# Altium footprint library HARTING THD.PcbLib: 113 footprints (part 9 of 11)
Each footprint in its own frame and in the unit in brackets; x right, y up, seen from the top. Pads: shape width x height; smd on the part's side, far side on the other; paste and mask are expansions set on the pad; w line width, h text height; cw(c..) or ccw(c..) is an arc to the next point about the centre after c.
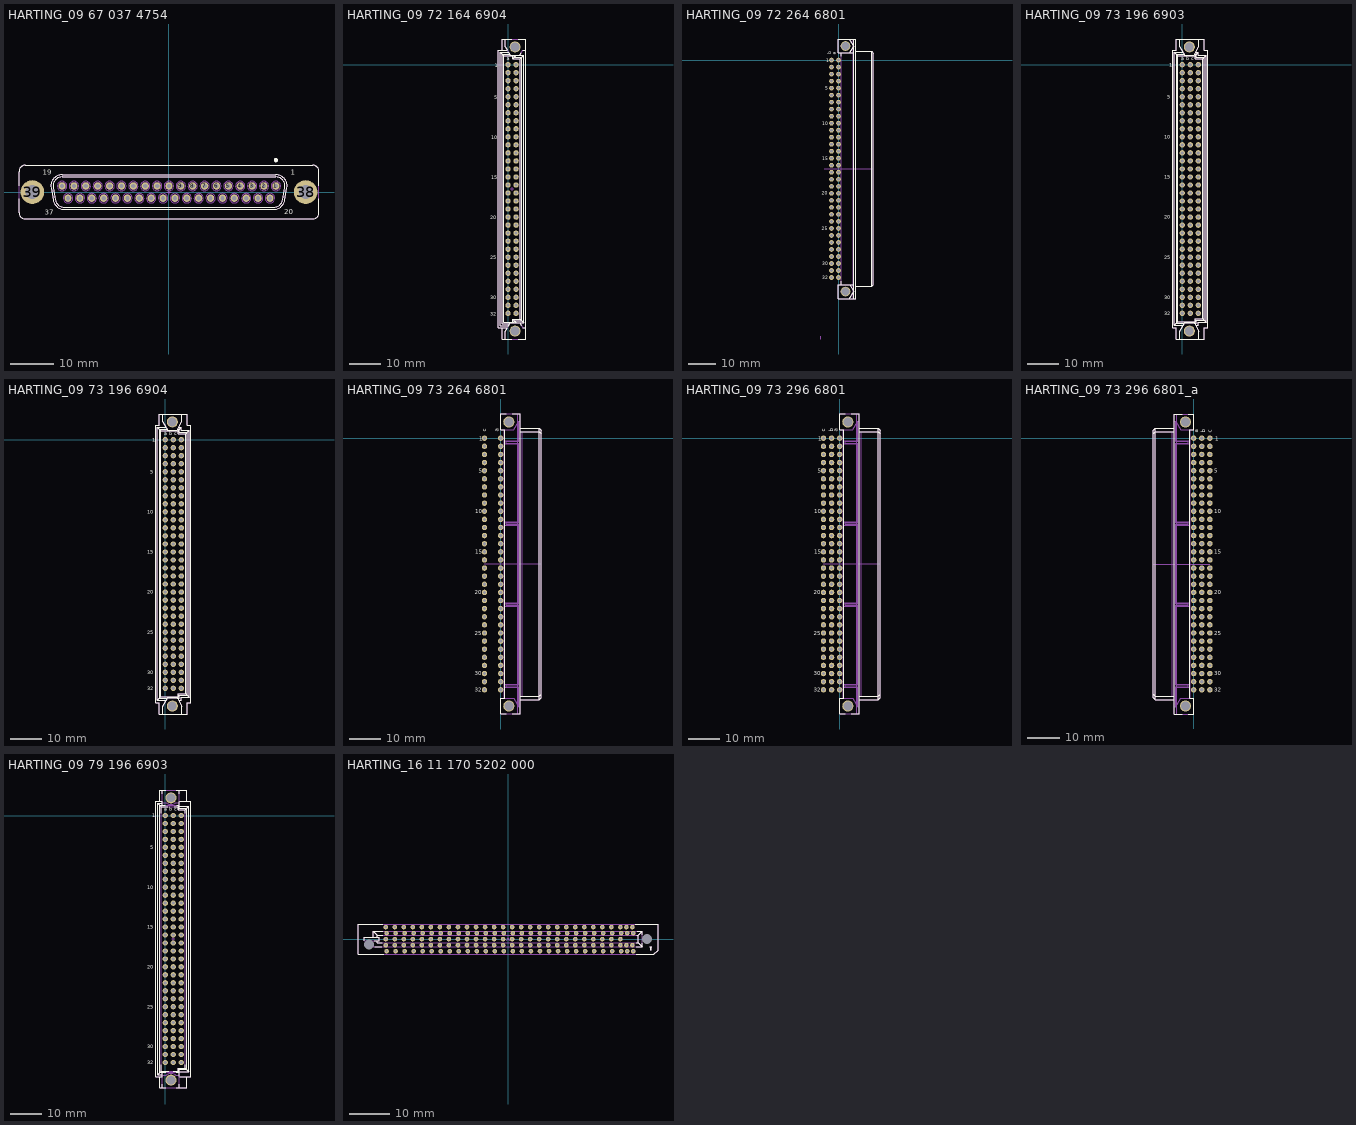
[diagram p8: the footprints below, top view; thin cyan lines are the x and y axes]

## HARTING_09 67 037 4754 [mm] "Straight D-Sub 37 Female Contacts with Turned Soder Contacts and Hole"
height 12.3
pads (39):
  round 1.7 hole 1: 1(24.84,1.42) 2(22.08,1.42) 3(19.32,1.42) 4(16.56,1.42) 5(13.8,1.42) 6(11.04,1.42) 7(8.28,1.42) 8(5.52,1.42) 9(2.76,1.42) 10(0,1.42) 11(-2.76,1.42) 12(-5.52,1.42) 13(-8.28,1.42) 14(-11.04,1.42) 15(-13.8,1.42) 16(-16.56,1.42) 17(-19.32,1.42) 18(-22.08,1.42) 19(-24.84,1.42) 20(23.46,-1.42) 21(20.7,-1.42) 22(17.94,-1.42) 23(15.18,-1.42) 24(12.42,-1.42) 25(9.66,-1.42) 26(6.9,-1.42) 27(4.14,-1.42) 28(1.38,-1.42) 29(-1.38,-1.42) 30(-4.14,-1.42) 31(-6.9,-1.42) 32(-9.66,-1.42) 33(-12.42,-1.42) 34(-15.18,-1.42) 35(-17.94,-1.42) 36(-20.7,-1.42) 37(-23.46,-1.42)
  round 5.5 hole 3.2: 38(31.75,0) 39(-31.75,0)
Top Overlay:
  circle w0.5: c24.84,7.42 r0.25
  lines w0.2: -34.85,-1.5 -34.85,-4.75 ccw(c-33.35,-4.75) -33.35,-6.25 33.35,-6.25 ccw(c33.35,-4.75) 34.85,-4.75 34.85,-1.5 ; -34.85,1.5 -34.85,4.75 cw(c-33.35,4.75) -33.35,6.25 33.35,6.25 cw(c33.35,4.75) 34.85,4.75 34.85,1.5 ; -27.41,0.949 cw(c-24.85,1.4) -24.85,4 24.85,4 cw(c24.85,1.4) 27.411,0.949 26.917,-1.851 cw(c24.356,-1.4) 24.356,-4 -24.356,-4 cw(c-24.356,-1.4) -26.917,-1.851 -27.41,0.949 ; -26.918,1.035 cw(c-24.85,1.4) -24.85,3.5 24.85,3.5 cw(c24.85,1.4) 26.918,1.035 26.424,-1.765 cw(c24.356,-1.4) 24.356,-3.5 -24.356,-3.5 cw(c-24.356,-1.4) -26.424,-1.765 -26.918,1.035
  text "20" at 26.78,-5.2 h1.2
  text "37" at -28.86,-5.27 h1.2
  text "1" at 28.28,4 h1.2
  text "19" at -29.28,4 h1.2
Mechanical 8:
  drawing of 160 lines, arcs and shapes, not listed
Mechanical 14:
  circle w0.1: c24.83,1.4 r1.1
  circle w0.1: c24.83,1.4 r0.7
  circle w0.1: c23.46,-1.42 r1.1
  circle w0.1: c23.46,-1.42 r0.7
  circle w0.1: c22.07,1.4 r1.1
  circle w0.1: c22.07,1.4 r0.7
  circle w0.1: c20.7,-1.42 r1.1
  circle w0.1: c20.7,-1.42 r0.7
  circle w0.1: c19.31,1.4 r1.1
  circle w0.1: c19.31,1.4 r0.7
  circle w0.1: c17.94,-1.42 r1.1
  circle w0.1: c17.94,-1.42 r0.7
  circle w0.1: c16.55,1.4 r1.1
  circle w0.1: c16.55,1.4 r0.7
  circle w0.1: c15.18,-1.42 r1.1
  circle w0.1: c15.18,-1.42 r0.7
  circle w0.1: c13.79,1.4 r1.1
  circle w0.1: c13.79,1.4 r0.7
  circle w0.1: c12.42,-1.42 r1.1
  circle w0.1: c12.42,-1.42 r0.7
  circle w0.1: c11.03,1.4 r1.1
  circle w0.1: c11.03,1.4 r0.7
  circle w0.1: c9.66,-1.42 r1.1
  circle w0.1: c9.66,-1.42 r0.7
  circle w0.1: c8.27,1.4 r1.1
  circle w0.1: c8.27,1.4 r0.7
  circle w0.1: c6.9,-1.42 r1.1
  circle w0.1: c6.9,-1.42 r0.7
  circle w0.1: c5.51,1.4 r1.1
  circle w0.1: c5.51,1.4 r0.7
  circle w0.1: c4.14,-1.42 r1.1
  circle w0.1: c4.14,-1.42 r0.7
  circle w0.1: c2.75,1.4 r1.1
  circle w0.1: c2.75,1.4 r0.7
  circle w0.1: c1.38,-1.42 r1.1
  circle w0.1: c1.38,-1.42 r0.7
  circle w0.1: c-0.01,1.4 r1.1
  circle w0.1: c-0.01,1.4 r0.7
  circle w0.1: c-1.38,-1.42 r1.1
  circle w0.1: c-1.38,-1.42 r0.7
  circle w0.1: c-2.77,1.4 r1.1
  circle w0.1: c-2.77,1.4 r0.7
  circle w0.1: c-4.14,-1.42 r1.1
  circle w0.1: c-4.14,-1.42 r0.7
  circle w0.1: c-5.53,1.4 r1.1
  circle w0.1: c-5.53,1.4 r0.7
  circle w0.1: c-6.9,-1.42 r1.1
  circle w0.1: c-6.9,-1.42 r0.7
  circle w0.1: c-8.29,1.4 r1.1
  circle w0.1: c-8.29,1.4 r0.7
  circle w0.1: c-9.66,-1.42 r1.1
  circle w0.1: c-9.66,-1.42 r0.7
  circle w0.1: c-11.05,1.4 r1.1
  circle w0.1: c-11.05,1.4 r0.7
  circle w0.1: c-12.42,-1.42 r1.1
  circle w0.1: c-12.42,-1.42 r0.7
  circle w0.1: c-13.81,1.4 r1.1
  circle w0.1: c-13.81,1.4 r0.7
  circle w0.1: c-15.18,-1.42 r1.1
  circle w0.1: c-15.18,-1.42 r0.7
  circle w0.1: c-16.57,1.4 r1.1
  circle w0.1: c-16.57,1.4 r0.7
  circle w0.1: c-17.94,-1.42 r1.1
  circle w0.1: c-17.94,-1.42 r0.7
  circle w0.1: c-19.33,1.4 r1.1
  circle w0.1: c-19.33,1.4 r0.7
  circle w0.1: c-20.7,-1.42 r1.1
  circle w0.1: c-20.7,-1.42 r0.7
  circle w0.1: c-22.09,1.4 r1.1
  circle w0.1: c-22.09,1.4 r0.7
  circle w0.1: c-23.46,-1.42 r1.1
  circle w0.1: c-23.46,-1.42 r0.7
  circle w0.1: c-24.85,1.4 r1.1
  circle w0.1: c-24.85,1.4 r0.7
  circle w0.1: c-31.75,0 r1.55
  circle w0.1: c31.75,0 r1.55
  lines w0.1: -34.85,-4.75 ccw(c-33.35,-4.75) -33.35,-6.25 33.35,-6.25 ccw(c33.35,-4.75) 34.85,-4.75 34.85,4.75 ccw(c33.35,4.75) 33.35,6.25 -33.35,6.25 ccw(c-33.35,4.75) -34.85,4.75 -34.85,-4.75 ; -27.41,0.949 cw(c-24.85,1.4) -24.85,4 24.85,4 cw(c24.85,1.4) 27.411,0.949 26.917,-1.851 cw(c24.356,-1.4) 24.356,-4 -24.356,-4 cw(c-24.356,-1.4) -26.917,-1.851 -27.41,0.949 ; -26.918,1.035 cw(c-24.85,1.4) -24.85,3.5 24.85,3.5 cw(c24.85,1.4) 26.918,1.035 26.424,-1.765 cw(c24.356,-1.4) 24.356,-3.5 -24.356,-3.5 cw(c-24.356,-1.4) -26.424,-1.765 -26.918,1.035
  text "20" at 26.78,-5.2 h1.2
  text "37" at -28.86,-5.27 h1.2
  text "1" at 28.28,4 h1.2
  text "19" at -29.28,4 h1.2
3D body "HARTING_09 67 037 4754.stp": height 12, standoff -6, extent -34.85,-6.25 34.85,6.25

## HARTING_09 72 164 6904 [mm] "DIN 41612, Type Q, Thru-Hole Press-in; Rows a+b, 64 Position, Straight Male Connector"
height 11.6
pads (66):
  round 1.7 hole 1: a1(0,0) a2(0,-2.54) a3(0,-5.08) a4(0,-7.62) a5(0,-10.16) a6(0,-12.7) a7(0,-15.24) a8(0,-17.78) a9(0,-20.32) a10(0,-22.86) a11(0,-25.4) a12(0,-27.94) a13(0,-30.48) a14(0,-33.02) a15(0,-35.56) a16(0,-38.1) a17(0,-40.64) a18(0,-43.18) a19(0,-45.72) a20(0,-48.26) a21(0,-50.8) a22(0,-53.34) a23(0,-55.88) a24(0,-58.42) a25(0,-60.96) a26(0,-63.5) a27(0,-66.04) a28(0,-68.58) a29(0,-71.12) a30(0,-73.66) a31(0,-76.2) a32(0,-78.74) b1(2.54,0) b2(2.54,-2.54) b3(2.54,-5.08) b4(2.54,-7.62) b5(2.54,-10.16) b6(2.54,-12.7) b7(2.54,-15.24) b8(2.54,-17.78) b9(2.54,-20.32) b10(2.54,-22.86) b11(2.54,-25.4) b12(2.54,-27.94) b13(2.54,-30.48) b14(2.54,-33.02) b15(2.54,-35.56) b16(2.54,-38.1) b17(2.54,-40.64) b18(2.54,-43.18) b19(2.54,-45.72) b20(2.54,-48.26) b21(2.54,-50.8) b22(2.54,-53.34) b23(2.54,-55.88) b24(2.54,-58.42) b25(2.54,-60.96) b26(2.54,-63.5) b27(2.54,-66.04) b28(2.54,-68.58) b29(2.54,-71.12) b30(2.54,-73.66) b31(2.54,-76.2) b32(2.54,-78.74)
  round 3.5 / inner round 3.5 / far side round 5.1 hole 2.8: MTG1(2.24,5.63) MTG2(2.24,-84.37)
Top Overlay:
  lines w0.2: -1.83,-83.32 -1.83,-86.87 1.22,-86.87 ; -1.83,4.58 -1.83,8.13 1.22,8.13 ; -0.81,-86.87 -0.81,-84.37 -0.327,-83.534 ; -0.81,8.13 -0.81,5.63 -0.327,4.794 ; -0.247,4.58 -3.03,4.58 -3.03,-83.32 -0.204,-83.32 ; 0.184,3.88 -2.48,3.88 ; 0.2,-82.62 -2.48,-82.62 -2.48,3.88 ; 0.232,-82.565 0.749,-81.67 3.731,-81.67 ; 0.232,3.825 0.749,2.93 3.731,2.93 ; 0.576,-81.97 -1.83,-81.97 -1.83,3.23 0.576,3.23 ; 1.67,-81.67 1.52,-81.52 ; 1.67,2.93 1.52,2.78 ; 1.97,-81.67 1.97,-81.02 4.37,-81.02 4.37,2.28 1.97,2.28 1.97,2.93 ; 2.62,-81.67 1.52,-80.57 ; 2.62,2.93 1.52,1.83 ; 3.26,-86.87 5.57,-86.87 5.57,8.13 3.26,8.13 ; 4.248,-82.565 3.731,-81.67 ; 4.248,3.825 3.731,2.93 ; 4.728,-83.32 5.57,-83.323 ; 4.727,4.58 5.57,4.58 ; -2.48,3.88 -1.38,2.78 ; -1.38,2.78 -1.38,-81.52 1.52,-81.52 ; -1.38,2.78 1.52,2.78 ; 1.52,-81.52 1.52,-80.57 ; 1.52,-80.57 3.92,-80.57 ; 1.52,1.83 1.52,2.78 ; 1.52,1.83 3.92,1.83 ; 3.731,-81.67 5.02,-81.67 ; 3.731,2.93 5.02,2.93 ; 3.92,-80.57 5.02,-81.67 ; 3.92,-80.57 3.92,1.83 ; 3.92,1.83 5.02,2.93 ; 5.02,-81.67 5.02,2.93
  text "1" at -4.175,-0.75 h1.2
  text "15" at -5.3,-36.26 h1.2
  text "20" at -5.6,-48.96 h1.2
  text "25" at -5.6,-61.66 h1.2
  text "30" at -5.6,-74.36 h1.2
  text "10" at -5.3,-23.56 h1.2
  text "5" at -4.375,-10.91 h1.2
  text "32" at -5.6,-79.44 h1.2
  text "a" at -0.451,1.385 h1.2
Mechanical 8:
  lines w0.1: -0.5,-78.74 0,-78.74 ; -0.5,0 0,0 ; 0,-79.24 0,-78.74 ; 0,-78.24 0,-78.74 ; 0,-0.5 0,0 ; 0,0.5 0,0 ; 0.5,-78.74 0,-78.74 ; 0.5,0 0,0 ; 0.77,-39.37 1.27,-39.37 ; 1.27,-39.87 1.27,-39.37 ; 1.27,-38.87 1.27,-39.37 ; 1.77,-39.37 1.27,-39.37 ; 2.04,-78.74 2.54,-78.74 ; 2.04,0 2.54,0 ; 2.54,-79.24 2.54,-78.74 ; 2.54,-78.24 2.54,-78.74 ; 2.54,-0.5 2.54,0 ; 2.54,0.5 2.54,0 ; 3.04,-78.74 2.54,-78.74 ; 3.04,0 2.54,0
Mechanical 14:
  circle w0.1: c2.24,-84.37 r1.4
  circle w0.1: c2.24,5.63 r1.4
  lines w0.1: -1.83,-83.32 -1.83,-86.87 5.57,-86.87 5.57,8.13 -1.83,8.13 -1.83,4.58 ; -0.81,-86.87 -0.81,-84.37 0.749,-81.67 3.731,-81.67 ; -0.81,8.13 -0.81,5.63 0.749,2.93 3.731,2.93 ; -0.204,-83.32 -3.03,-83.32 -3.03,4.58 -0.204,4.58 ; 0.2,-82.62 -2.48,-82.62 -2.48,3.88 ; 0.2,3.88 -2.48,3.88 ; 0.576,-81.97 -1.83,-81.97 -1.83,3.23 0.576,3.23 ; 1.67,-81.67 1.52,-81.52 ; 1.67,2.93 1.52,2.78 ; 1.97,-81.67 1.97,-81.02 4.37,-81.02 4.37,2.28 1.97,2.28 1.97,2.93 ; 2.62,-81.67 1.52,-80.57 ; 2.62,2.93 1.52,1.83 ; 5.57,-83.323 4.684,-83.32 3.731,-81.67 ; 5.57,4.58 4.684,4.58 3.731,2.93 ; -2.48,3.88 -1.38,2.78 ; -1.38,2.78 -1.38,-81.52 1.52,-81.52 ; -1.38,2.78 1.52,2.78 ; 1.52,-81.52 1.52,-80.57 ; 1.52,-80.57 3.92,-80.57 ; 1.52,1.83 1.52,2.78 ; 1.52,1.83 3.92,1.83 ; 3.731,-81.67 5.02,-81.67 ; 3.731,2.93 5.02,2.93 ; 3.92,-80.57 5.02,-81.67 ; 3.92,-80.57 3.92,1.83 ; 3.92,1.83 5.02,2.93 ; 5.02,-81.67 5.02,2.93
  text "30" at -5.6,-74.36 h1.2
  text "25" at -5.6,-61.66 h1.2
  text "20" at -5.6,-48.96 h1.2
  text "15" at -5.3,-36.26 h1.2
  text "10" at -5.3,-23.56 h1.2
  text "5" at -4.375,-10.91 h1.2
  text "32" at -5.6,-79.44 h1.2
  text "a" at -0.451,1.385 h1.2
  text "1" at -4.175,-0.75 h1.2
Drill Drawing:
  lines w0.1: -1.83,-59.13 -1.83,-80.585 3.92,-80.585 3.92,1.83 -1.83,1.83 -1.83,-21.03
  text "PRESS-FIT TECHNOLOGY diam. 1mm +0.1 -0" at -1.315,-57.225 h1
3D body "HARTING_09 72 164 6904.stp": height 11.6, standoff -4.8, extent -3.03,-86.87 5.57,8.13

## HARTING_09 72 264 6801 [mm] "DIN 41612, Type Q, Thru-Hole;  Rows a+b, 64 Positions, Performance level 2, Lead 3mm, Pitch 2.54mm, Right Angle Female Connector"
height 8.1
pads (66):
  round 1.7 hole 1: a1(0,0) a2(0,-2.54) a3(0,-5.08) a4(0,-7.62) a5(0,-10.16) a6(0,-12.7) a7(0,-15.24) a8(0,-17.78) a9(0,-20.32) a10(0,-22.86) a11(0,-25.4) a12(0,-27.94) a13(0,-30.48) a14(0,-33.02) a15(0,-35.56) a16(0,-38.1) a17(0,-40.64) a18(0,-43.18) a19(0,-45.72) a20(0,-48.26) a21(0,-50.8) a22(0,-53.34) a23(0,-55.88) a24(0,-58.42) a25(0,-60.96) a26(0,-63.5) a27(0,-66.04) a28(0,-68.58) a29(0,-71.12) a30(0,-73.66) a31(0,-76.2) a32(0,-78.74) b1(-2.54,0) b2(-2.54,-2.54) b3(-2.54,-5.08) b4(-2.54,-7.62) b5(-2.54,-10.16) b6(-2.54,-12.7) b7(-2.54,-15.24) b8(-2.54,-17.78) b9(-2.54,-20.32) b10(-2.54,-22.86) b11(-2.54,-25.4) b12(-2.54,-27.94) b13(-2.54,-30.48) b14(-2.54,-33.02) b15(-2.54,-35.56) b16(-2.54,-38.1) b17(-2.54,-40.64) b18(-2.54,-43.18) b19(-2.54,-45.72) b20(-2.54,-48.26) b21(-2.54,-50.8) b22(-2.54,-53.34) b23(-2.54,-55.88) b24(-2.54,-58.42) b25(-2.54,-60.96) b26(-2.54,-63.5) b27(-2.54,-66.04) b28(-2.54,-68.58) b29(-2.54,-71.12) b30(-2.54,-73.66) b31(-2.54,-76.2) b32(-2.54,-78.74)
  round 3.5 / inner round 3.5 / far side round 5.1 hole 2.8: MTG1(2.54,5.08) MTG2(2.54,-83.82)
Top Overlay:
  lines w0.2: 0.94,-81.37 0.94,-80.14 ; 0.94,1.4 0.94,2.63 ; 3.955,-86.37 5.427,-83.82 4.012,-81.37 ; 3.955,7.63 5.427,5.08 4.012,2.63 ; 5.59,-86.37 5.59,7.63 ; 5.59,-81.37 -0.06,-81.37 -0.06,-86.37 6.19,-86.37 6.19,7.63 -0.06,7.63 -0.06,2.63 5.59,2.63 ; 6.19,-81.87 12.04,-81.87 ; 6.19,3.13 12.04,3.13 ; 12.04,-81.87 12.64,-81.27 12.64,2.53 12.04,3.13 ; 12.04,-81.87 12.04,3.13
  text "1" at -4.505,-0.725 h1.2
  text "b" at -2.65,2.025 h1.2
  text "a" at -0.95,1.99 h1.2
  text "32" at -5.955,-79.365 h1.2
  text "5" at -4.855,-10.785 h1.2
  text "10" at -5.83,-23.535 h1.2
  text "15" at -5.83,-36.235 h1.2
  text "20" at -6.055,-48.81 h1.2
  text "25" at -6,-61.575 h1.2
  text "30" at -5.98,-74.285 h1.2
Mechanical 8:
  lines w0.1: -5.08,-39.37 12.64,-39.37 ; -3.04,-78.74 -2.54,-78.74 ; -3.04,0 -2.54,0 ; -2.54,-79.24 -2.54,-78.74 ; -2.54,-78.24 -2.54,-78.74 ; -2.54,-0.5 -2.54,0 ; -2.54,0.5 -2.54,0 ; -2.04,-78.74 -2.54,-78.74 ; -2.04,0 -2.54,0 ; -0.5,-78.74 0,-78.74 ; -0.5,0 0,0 ; 0,-79.24 0,-78.74 ; 0,-78.24 0,-78.74 ; 0,-0.5 0,0 ; 0,0.5 0,0 ; 0.5,-78.74 0,-78.74 ; 0.5,0 0,0 ; 2.04,-83.82 2.54,-83.82 ; 2.04,5.08 2.54,5.08 ; 2.54,-84.32 2.54,-83.82 ; 2.54,-83.32 2.54,-83.82 ; 2.54,4.58 2.54,5.08 ; 2.54,5.58 2.54,5.08 ; 3.04,-83.82 2.54,-83.82 ; 3.04,5.08 2.54,5.08 ; 5.3,-86.37 5.3,-39.37 5.3,7.63
  text "PCB" at 5.08,-41.275 h1.2
Mechanical 14:
  lines w0.1: -6.5,-101 -6.5,-100 ; 0.94,-81.37 0.94,2.63 ; 3.955,-86.37 5.427,-83.82 4.012,-81.37 ; 3.955,7.63 5.427,5.08 4.012,2.63 ; 5.59,-86.37 5.59,7.63 ; 5.59,-81.37 -0.06,-81.37 -0.06,-86.37 6.19,-86.37 6.19,7.63 -0.06,7.63 -0.06,2.63 5.59,2.63 ; 6.19,-81.87 12.04,-81.87 ; 6.19,3.13 12.04,3.13 ; 12.04,-81.87 12.64,-81.27 12.64,2.53 12.04,3.13 ; 12.04,-81.87 12.04,3.13 ; 1.04,-84.02 1.306,-84.02 ccw(c2.54,-83.82) 3.774,-84.02 4.04,-84.02 4.04,-83.62 3.774,-83.62 ccw(c2.54,-83.82) 1.306,-83.62 1.04,-83.62 1.04,-84.02 ; 1.04,4.88 1.04,5.28 1.306,5.28 cw(c2.54,5.08) 3.774,5.28 4.04,5.28 4.04,4.88 3.774,4.88 cw(c2.54,5.08) 1.306,4.88 1.04,4.88
  text "a" at -0.95,1.99 h1.2
  text "b" at -2.65,2.025 h1.2
  text "32" at -5.955,-79.365 h1.2
  text "10" at -5.83,-23.535 h1.2
  text "20" at -6.055,-48.81 h1.2
  text "30" at -5.98,-74.285 h1.2
  text "1" at -4.505,-0.725 h1.2
  text "5" at -4.855,-10.785 h1.2
3D body "HARTING_09 72 264 6801.stp": height 6.78, standoff -2.93, extent -2.84,-86.37 12.64,7.63

## HARTING_09 73 196 6903 [mm] "DIN 41612, Type R, 96 Position, Rows a+b+c, Performance level 2, Straight Male Connector, Lead 4.0 mm, Pitch 2.54mm"
height 11.6
pads (98):
  round 1.7 hole 1: a1(0,0) a2(0,-2.54) a3(0,-5.08) a4(0,-7.62) a5(0,-10.16) a6(0,-12.7) a7(0,-15.24) a8(0,-17.78) a9(0,-20.32) a10(0,-22.86) a11(0,-25.4) a12(0,-27.94) a13(0,-30.48) a14(0,-33.02) a15(0,-35.56) a16(0,-38.1) a17(0,-40.64) a18(0,-43.18) a19(0,-45.72) a20(0,-48.26) a21(0,-50.8) a22(0,-53.34) a23(0,-55.88) a24(0,-58.42) a25(0,-60.96) a26(0,-63.5) a27(0,-66.04) a28(0,-68.58) a29(0,-71.12) a30(0,-73.66) a31(0,-76.2) a32(0,-78.74) b1(2.54,0) b2(2.54,-2.54) b3(2.54,-5.08) b4(2.54,-7.62) b5(2.54,-10.16) b6(2.54,-12.7) b7(2.54,-15.24) b8(2.54,-17.78) b9(2.54,-20.32) b10(2.54,-22.86) b11(2.54,-25.4) b12(2.54,-27.94) b13(2.54,-30.48) b14(2.54,-33.02) b15(2.54,-35.56) b16(2.54,-38.1) b17(2.54,-40.64) b18(2.54,-43.18) b19(2.54,-45.72) b20(2.54,-48.26) b21(2.54,-50.8) b22(2.54,-53.34) b23(2.54,-55.88) b24(2.54,-58.42) b25(2.54,-60.96) b26(2.54,-63.5) b27(2.54,-66.04) b28(2.54,-68.58) b29(2.54,-71.12) b30(2.54,-73.66) b31(2.54,-76.2) b32(2.54,-78.74) c1(5.08,0) c2(5.08,-2.54) c3(5.08,-5.08) c4(5.08,-7.62) c5(5.08,-10.16) c6(5.08,-12.7) c7(5.08,-15.24) c8(5.08,-17.78) c9(5.08,-20.32) c10(5.08,-22.86) c11(5.08,-25.4) c12(5.08,-27.94) c13(5.08,-30.48) c14(5.08,-33.02) c15(5.08,-35.56) c16(5.08,-38.1) c17(5.08,-40.64) c18(5.08,-43.18) c19(5.08,-45.72) c20(5.08,-48.26) c21(5.08,-50.8) c22(5.08,-53.34) c23(5.08,-55.88) c24(5.08,-58.42) c25(5.08,-60.96) c26(5.08,-63.5) c27(5.08,-66.04) c28(5.08,-68.58) c29(5.08,-71.12) c30(5.08,-73.66) c31(5.08,-76.2) c32(5.08,-78.74)
  round 3.5 / inner round 3.5 / far side round 5.1 hole 2.8: MTG1(2.24,5.63) MTG2(2.24,-84.37)
Top Overlay:
  lines w0.2: -0.775,-86.87 -0.775,-84.37 0.755,-81.72 3.725,-81.72 5.255,-84.37 5.255,-86.87 ; -0.775,8.13 -0.775,5.63 0.755,2.98 3.725,2.98 5.255,5.63 5.255,8.13 ; 0.206,3.93 -2.46,3.93 ; 0.264,-82.57 -2.46,-82.57 ; 0.582,3.28 -1.81,3.28 -1.81,-81.92 0.64,-81.92 ; 3.84,-81.92 4.49,-81.92 4.49,-80.97 6.89,-80.97 6.89,2.33 4.49,2.33 4.49,3.28 3.898,3.28 ; 4.216,-82.57 5.14,-82.57 5.14,-81.62 7.54,-81.62 ; 4.274,3.93 5.14,3.93 ; -2.46,-82.57 -2.46,3.93 ; -2.46,-82.57 -1.36,-81.47 ; -2.46,3.93 -1.36,2.83 ; -1.36,-81.47 4.04,-81.47 4.04,-80.52 6.44,-80.52 ; -1.36,-81.47 -1.36,2.83 ; -1.36,2.83 4.04,2.83 ; 4.04,2.83 4.04,1.88 6.44,1.88 ; 4.04,2.83 5.14,3.93 ; 5.14,3.93 5.14,2.98 7.54,2.98 ; 6.44,-80.52 6.44,1.88 ; 6.44,-80.52 7.54,-81.62 ; 6.44,1.88 7.54,2.98 ; 7.54,-81.62 7.54,2.98 ; -3.01,-83.32 -3.01,4.58 -1.835,4.58 -1.835,8.13 6.915,8.13 6.915,4.58 8.09,4.58 8.09,-83.32 6.915,-83.32 6.915,-86.87 -1.835,-86.87 -1.835,-83.32 -3.01,-83.32
  text "1" at -4.127,-0.6 h1.2
  text "5" at -4.763,-10.76 h1.2
  text "a" at -0.343,1.387 h1.2
  text "b" at 1.245,1.387 h1.2
  text "c" at 2.832,1.387 h1.2
  text "10" at -5.715,-23.46 h1.2
  text "15" at -5.715,-36.16 h1.2
  text "20" at -5.715,-48.86 h1.2
  text "25" at -5.715,-61.56 h1.2
  text "30" at -5.715,-74.26 h1.2
  text "32" at -5.715,-79.34 h1.2
Mechanical 8:
  lines w0.1: -0.5,-78.74 0,-78.74 ; -0.5,0 0,0 ; 0,-79.24 0,-78.74 ; 0,-78.24 0,-78.74 ; 0,-0.5 0,0 ; 0,0.5 0,0 ; 0.5,-78.74 0,-78.74 ; 0.5,0 0,0 ; 1.74,-84.37 2.24,-84.37 ; 1.74,5.63 2.24,5.63 ; 2.04,-78.74 2.54,-78.74 ; 2.04,0 2.54,0 ; 2.24,-84.87 2.24,-84.37 ; 2.24,-83.87 2.24,-84.37 ; 2.24,5.13 2.24,5.63 ; 2.24,6.13 2.24,5.63 ; 2.54,-79.24 2.54,-78.74 ; 2.54,-78.24 2.54,-78.74 ; 2.54,-0.5 2.54,0 ; 2.54,0.5 2.54,0 ; 2.74,-84.37 2.24,-84.37 ; 2.74,5.63 2.24,5.63 ; 3.04,-78.74 2.54,-78.74 ; 3.04,0 2.54,0 ; 4.58,-78.74 5.08,-78.74 ; 4.58,0 5.08,0 ; 5.08,-79.24 5.08,-78.74 ; 5.08,-78.24 5.08,-78.74 ; 5.08,-0.5 5.08,0 ; 5.08,0.5 5.08,0 ; 5.58,-78.74 5.08,-78.74 ; 5.58,0 5.08,0
Mechanical 14:
  circle w0.1: c2.24,5.63 r1.4
  circle w0.1: c2.24,-84.37 r1.4
  lines w0.1: -0.775,-86.87 -0.775,-84.37 0.755,-81.72 3.725,-81.72 5.255,-84.37 5.255,-86.87 ; -0.775,8.13 -0.775,5.63 0.755,2.98 3.725,2.98 5.255,5.63 5.255,8.13 ; 0.206,3.93 -2.46,3.93 ; 0.264,-82.57 -2.46,-82.57 ; 0.582,3.28 -1.81,3.28 -1.81,-81.92 0.64,-81.92 ; 3.84,-81.92 4.49,-81.92 4.49,-80.97 6.89,-80.97 6.89,2.33 4.49,2.33 4.49,3.28 3.898,3.28 ; 4.216,-82.57 5.14,-82.57 5.14,-81.62 7.54,-81.62 ; 4.274,3.93 5.14,3.93 ; -2.46,-82.57 -2.46,3.93 ; -2.46,-82.57 -1.36,-81.47 ; -2.46,3.93 -1.36,2.83 ; -1.36,-81.47 4.04,-81.47 4.04,-80.52 6.44,-80.52 ; -1.36,-81.47 -1.36,2.83 ; -1.36,2.83 4.04,2.83 ; 4.04,2.83 4.04,1.88 6.44,1.88 ; 4.04,2.83 5.14,3.93 ; 5.14,3.93 5.14,2.98 7.54,2.98 ; 6.44,-80.52 6.44,1.88 ; 6.44,-80.52 7.54,-81.62 ; 6.44,1.88 7.54,2.98 ; 7.54,-81.62 7.54,2.98 ; -3.01,-83.32 -3.01,4.58 -1.835,4.58 -1.835,8.13 6.915,8.13 6.915,4.58 8.09,4.58 8.09,-83.32 6.915,-83.32 6.915,-86.87 -1.835,-86.87 -1.835,-83.32 -3.01,-83.32
  text "32" at -5.715,-79.34 h1.2
  text "30" at -5.715,-74.26 h1.2
  text "25" at -5.715,-61.56 h1.2
  text "20" at -5.715,-48.86 h1.2
  text "15" at -5.715,-36.16 h1.2
  text "10" at -5.715,-23.46 h1.2
  text "c" at 2.832,1.387 h1.2
  text "b" at 1.245,1.387 h1.2
  text "a" at -0.343,1.387 h1.2
  text "5" at -4.763,-10.76 h1.2
  text "1" at -4.127,-0.6 h1.2
3D body "HARTING_09 73 196 6903.stp": height 11.6, standoff -4, extent -3.01,-86.87 8.09,8.13

## HARTING_09 73 196 6904 [mm] "DIN 41612, Type R, 96 Position, Rows a+b+c, Performance level 2, Press-in Lead 5.0 mm, Pitch 2.54mm, Straight Male Connector"
height 11.6
pads (98):
  round 1.7 hole 1: a1(0,0) a2(0,-2.54) a3(0,-5.08) a4(0,-7.62) a5(0,-10.16) a6(0,-12.7) a7(0,-15.24) a8(0,-17.78) a9(0,-20.32) a10(0,-22.86) a11(0,-25.4) a12(0,-27.94) a13(0,-30.48) a14(0,-33.02) a15(0,-35.56) a16(0,-38.1) a17(0,-40.64) a18(0,-43.18) a19(0,-45.72) a20(0,-48.26) a21(0,-50.8) a22(0,-53.34) a23(0,-55.88) a24(0,-58.42) a25(0,-60.96) a26(0,-63.5) a27(0,-66.04) a28(0,-68.58) a29(0,-71.12) a30(0,-73.66) a31(0,-76.2) a32(0,-78.74) b1(2.54,0) b2(2.54,-2.54) b3(2.54,-5.08) b4(2.54,-7.62) b5(2.54,-10.16) b6(2.54,-12.7) b7(2.54,-15.24) b8(2.54,-17.78) b9(2.54,-20.32) b10(2.54,-22.86) b11(2.54,-25.4) b12(2.54,-27.94) b13(2.54,-30.48) b14(2.54,-33.02) b15(2.54,-35.56) b16(2.54,-38.1) b17(2.54,-40.64) b18(2.54,-43.18) b19(2.54,-45.72) b20(2.54,-48.26) b21(2.54,-50.8) b22(2.54,-53.34) b23(2.54,-55.88) b24(2.54,-58.42) b25(2.54,-60.96) b26(2.54,-63.5) b27(2.54,-66.04) b28(2.54,-68.58) b29(2.54,-71.12) b30(2.54,-73.66) b31(2.54,-76.2) b32(2.54,-78.74) c1(5.08,0) c2(5.08,-2.54) c3(5.08,-5.08) c4(5.08,-7.62) c5(5.08,-10.16) c6(5.08,-12.7) c7(5.08,-15.24) c8(5.08,-17.78) c9(5.08,-20.32) c10(5.08,-22.86) c11(5.08,-25.4) c12(5.08,-27.94) c13(5.08,-30.48) c14(5.08,-33.02) c15(5.08,-35.56) c16(5.08,-38.1) c17(5.08,-40.64) c18(5.08,-43.18) c19(5.08,-45.72) c20(5.08,-48.26) c21(5.08,-50.8) c22(5.08,-53.34) c23(5.08,-55.88) c24(5.08,-58.42) c25(5.08,-60.96) c26(5.08,-63.5) c27(5.08,-66.04) c28(5.08,-68.58) c29(5.08,-71.12) c30(5.08,-73.66) c31(5.08,-76.2) c32(5.08,-78.74)
  round 3.5 / inner round 3.5 / far side round 5.1 hole 2.8: MTG1(2.24,5.63) MTG2(2.24,-84.37)
Top Overlay:
  lines w0.2: -0.775,-86.87 -0.775,-84.37 0.755,-81.72 3.725,-81.72 5.255,-84.37 5.255,-86.87 ; -0.775,8.13 -0.775,5.63 0.755,2.98 3.725,2.98 5.255,5.63 5.255,8.13 ; 0.206,3.93 -2.46,3.93 ; 0.264,-82.57 -2.46,-82.57 ; 0.582,3.28 -1.81,3.28 -1.81,-81.92 0.64,-81.92 ; 3.84,-81.92 4.49,-81.92 4.49,-80.97 6.89,-80.97 6.89,2.33 4.49,2.33 4.49,3.28 3.898,3.28 ; 4.216,-82.57 5.14,-82.57 5.14,-81.62 7.54,-81.62 ; 4.274,3.93 5.14,3.93 ; -2.46,-82.57 -1.36,-81.47 ; -2.46,-82.57 -2.46,3.93 ; -2.46,3.93 -1.36,2.83 ; -1.36,-81.47 -1.36,2.83 ; -1.36,-81.47 4.04,-81.47 4.04,-80.52 6.44,-80.52 ; -1.36,2.83 4.04,2.83 ; 4.04,2.83 5.14,3.93 ; 4.04,2.83 4.04,1.88 6.44,1.88 ; 5.14,3.93 5.14,2.98 7.54,2.98 ; 6.44,-80.52 7.54,-81.62 ; 6.44,-80.52 6.44,1.88 ; 6.44,1.88 7.54,2.98 ; 7.54,-81.62 7.54,2.98 ; -3.01,-83.32 -1.835,-83.32 -1.835,-86.87 6.915,-86.87 6.915,-83.32 8.09,-83.32 8.09,4.58 6.915,4.58 6.915,8.13 -1.835,8.13 -1.835,4.58 -3.01,4.58 -3.01,-83.32
  text "32" at -5.715,-79.34 h1.2
  text "30" at -5.715,-74.26 h1.2
  text "25" at -5.715,-61.56 h1.2
  text "20" at -5.715,-48.86 h1.2
  text "15" at -5.715,-36.16 h1.2
  text "10" at -5.715,-23.46 h1.2
  text "c" at 2.832,1.387 h1.2
  text "b" at 1.245,1.387 h1.2
  text "a" at -0.343,1.387 h1.2
  text "5" at -4.763,-10.76 h1.2
  text "1" at -4.127,-0.6 h1.2
Mechanical 8:
  lines w0.1: -0.5,-78.74 0,-78.74 ; -0.5,0 0,0 ; 0,-79.24 0,-78.74 ; 0,-78.24 0,-78.74 ; 0,-0.5 0,0 ; 0,0.5 0,0 ; 0.5,-78.74 0,-78.74 ; 0.5,0 0,0 ; 1.74,-84.37 2.24,-84.37 ; 1.74,5.63 2.24,5.63 ; 2.04,-78.74 2.54,-78.74 ; 2.04,0 2.54,0 ; 2.24,-84.87 2.24,-84.37 ; 2.24,-83.87 2.24,-84.37 ; 2.24,5.13 2.24,5.63 ; 2.24,6.13 2.24,5.63 ; 2.54,-79.24 2.54,-78.74 ; 2.54,-78.24 2.54,-78.74 ; 2.54,-0.5 2.54,0 ; 2.54,0.5 2.54,0 ; 2.74,-84.37 2.24,-84.37 ; 2.74,5.63 2.24,5.63 ; 3.04,-78.74 2.54,-78.74 ; 3.04,0 2.54,0 ; 4.58,-78.74 5.08,-78.74 ; 4.58,0 5.08,0 ; 5.08,-79.24 5.08,-78.74 ; 5.08,-78.24 5.08,-78.74 ; 5.08,-0.5 5.08,0 ; 5.08,0.5 5.08,0 ; 5.58,-78.74 5.08,-78.74 ; 5.58,0 5.08,0